# Altium footprint library pcb.PcbLib: 397 footprints (part 3 of 25)
Each footprint in its own frame and in the unit in brackets; x right, y up, seen from the top. Pads: shape width x height; smd on the part's side, far side on the other; paste and mask are expansions set on the pad; w line width, h text height; cw(c..) or ccw(c..) is an arc to the next point about the centre after c.
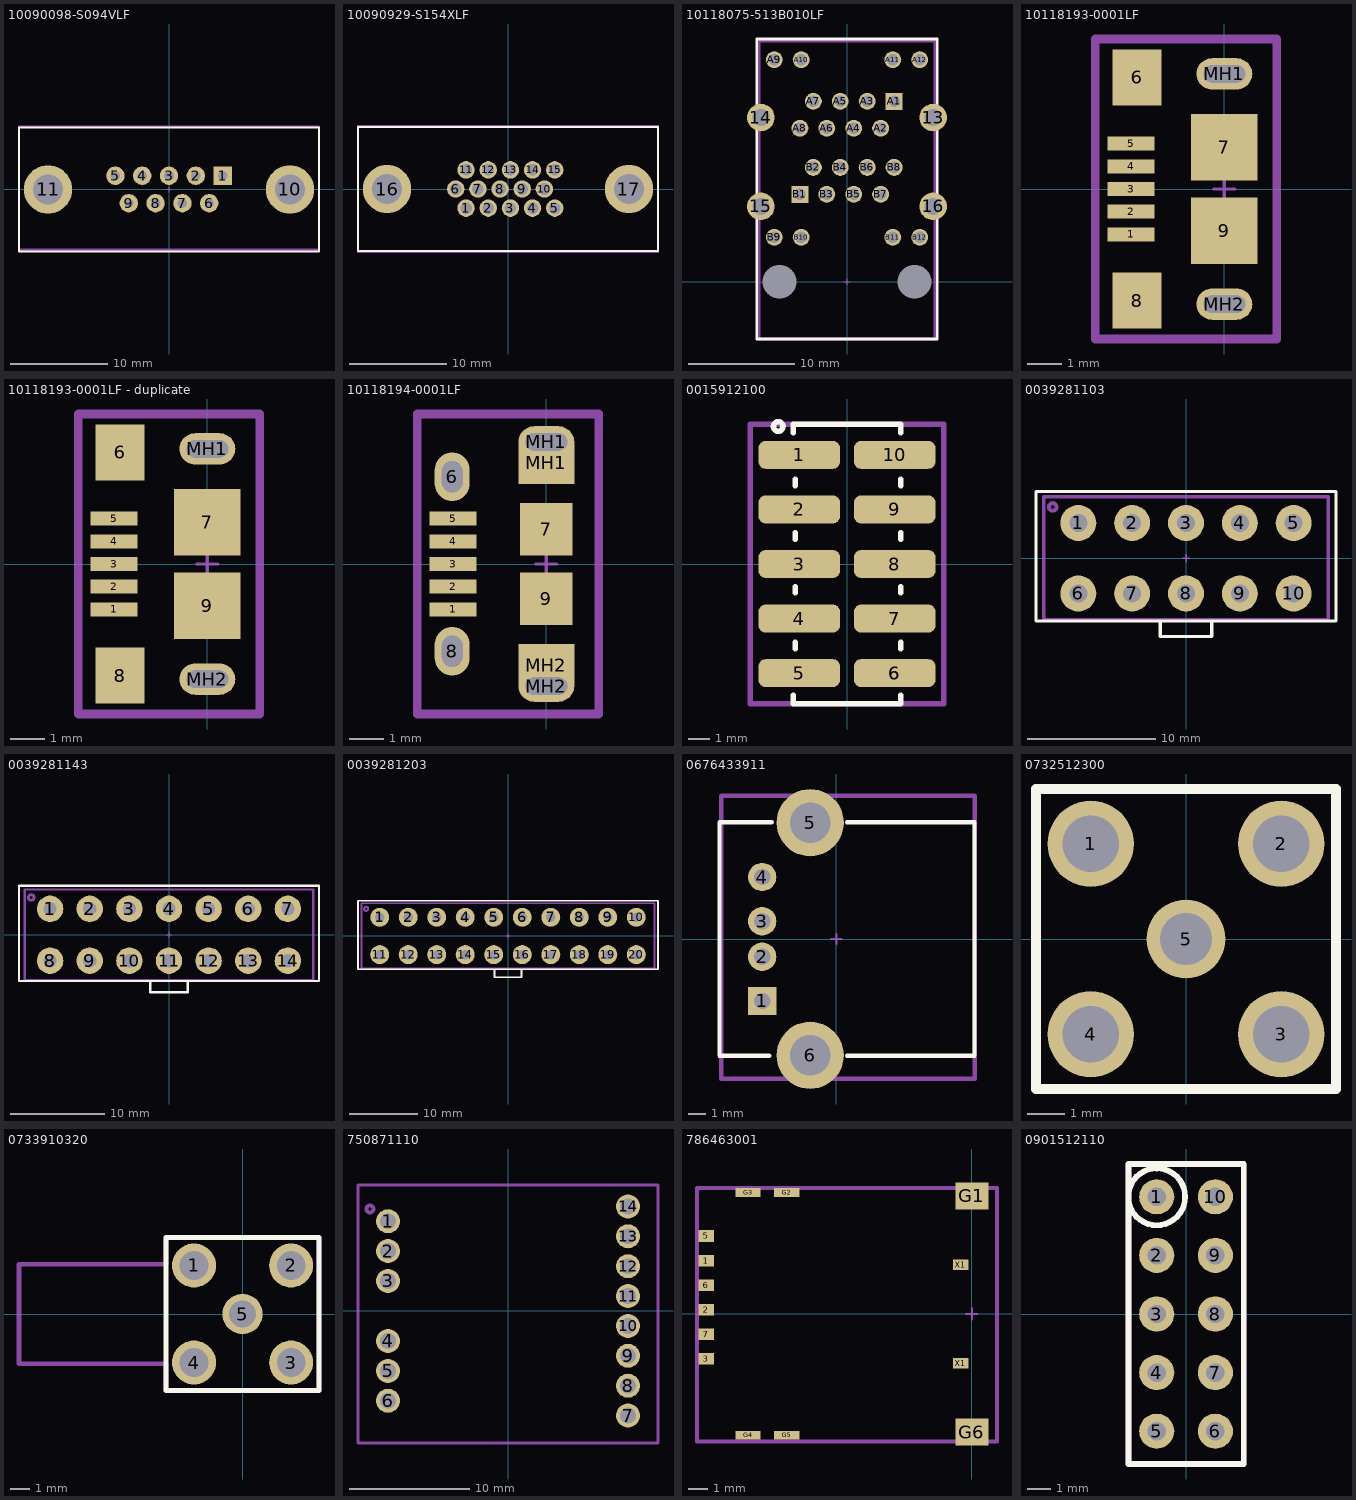
[diagram p2: the footprints below, top view; thin cyan lines are the x and y axes]

## 10090098-S094VLF [mm]
height 2.38
pads (11):
  rect 1.9x1.9 hole 1: 1(5.54,1.42)
  round 1.9 hole 1: 2(2.77,1.42) 3(0,1.42) 4(-2.77,1.42) 5(-5.54,1.42) 6(4.155,-1.42) 7(1.385,-1.42) 8(-1.385,-1.42) 9(-4.155,-1.42)
  round 5 hole 3.1: 10(12.5,0) 11(-12.5,0)
Top Overlay:
  lines w0.2: -15.5,-6.4 15.5,-6.4 15.5,6.4 -15.5,6.4 -15.5,-6.4
Mechanical 15:
  lines w0.1: -0.3,0 0.3,0 ; 0,-0.3 0,0.3
  lines w0.254: -15.5,-6.25 15.5,-6.25 15.5,6.5 -15.5,6.5 -15.5,-6.25
  text ".Designator" at -5.5,4 h1.02
3D body "c-1-1634218-2-f-3d.stp": height 13, standoff -3.9, extent -15.4,-6.3 15.4,6.25

## 10090929-S154XLF [mm]
height 2.38
pads (17):
  round 1.8 hole 1.2: 1(-4.33,-1.98) 2(-2.04,-1.98) 3(0.25,-1.98) 4(2.54,-1.98) 5(4.83,-1.98) 6(-5.402,0) 7(-3.112,0) 8(-0.817,0) 9(1.468,0) 10(3.758,0) 11(-4.33,1.98) 12(-2.04,1.98) 13(0.25,1.98) 14(2.54,1.98) 15(4.83,1.98)
  round 5 hole 3.1: 16(-12.5,0) 17(12.5,0)
Top Overlay:
  lines w0.2: -15.5,-6.4 -15.5,6.4 15.5,6.4 15.5,-6.4 -15.5,-6.4
Mechanical 15:
  lines w0.1: -0.3,0 0.3,0 ; 0,-0.3 0,0.3
  lines w0.254: -15.5,-6.5 15.5,-6.5 15.5,6.5 -15.5,6.5 -15.5,-6.5
  text ".Designator" at -11.75,4.5 h1.02
3D body "10090929-S15.stp": height 12.05, standoff -4.15, extent -15.405,-6.3 15.405,6.25

## 10118075-513B010LF [mm]
height 13.8
pads (30):
  round 2.6 hole 1.6: 13(8.13,15.49) 14(-8.13,15.49) 15(-8.13,7.11) 16(8.13,7.11)
  rect 1.6x1.6 hole 1.1: A1(4.445,17.02) B1(-4.445,8.25)
  round 1.6 hole 1.1: A2(3.175,14.48) A3(1.905,17.02) A4(0.635,14.48) A5(-0.635,17.02) A6(-1.905,14.48) A7(-3.175,17.02) A8(-4.445,14.48) A9(-6.86,20.95) A10(-4.32,20.95) A11(4.32,20.95) A12(6.86,20.95) B2(-3.175,10.79) B3(-1.905,8.25) B4(-0.635,10.79) B5(0.635,8.25) B6(1.905,10.79) B7(3.175,8.25) B8(4.445,10.79) B9(-6.86,4.19) B10(-4.32,4.19) B11(4.32,4.19) B12(6.86,4.19)
  round 0 hole 3.2 unplated: ""(-6.35,0) ""(6.35,0)
Top Overlay:
  lines w0.254: -8.5,-5.4 -8.5,22.9 8.5,22.9 8.5,-5.4 -8.5,-5.4
Mechanical 15:
  lines w0.1: -0.3,0 0.3,0 ; 0,-0.3 0,0.3
  lines w0.254: -8.3,-5.4 -8.3,22.7 8.3,22.7 8.3,-5.4 -8.3,-5.4
  text ".Designator" at -5.1,-4.5 h1.02
  text "pcb_edge" at -3.9,-6.8 h1.02
3D body "10118075.stp": height 26.22, standoff -3.3, extent -9.275,-5.6 9.275,22.65

## 10118193-0001LF [mm] "Connector; Micro USB Type B; 5 Position; Right Angle"
height 2
pads (11):
  rect 1.35x0.4 smd: 1(-2.675,-1.3) 2(-2.675,-0.65) 3(-2.675,0) 4(-2.675,0.65) 5(-2.675,1.3)
  rect 1.4x1.6 smd: 6(-2.5,3.2) 8(-2.5,-3.2)
  rect 1.9x1.9 smd: 7(0,1.2) 9(0,-1.2)
  oval 1.6x0.9 hole 0.5 slot 1.2 at 0 deg: MH1(0,3.3) MH2(0,-3.3)
Mechanical 15:
  lines w0.1: -0.3,0 0.3,0 ; 0,-0.3 0,0.3
  lines w0.254: -3.7,-4.3 -3.7,4.3 1.5,4.3 1.5,-4.3 -3.7,-4.3
  text "pcb_edge" at 2.6,-3.8 h1.02
  text ".Designator" at -1.2,-3.6 h1.02
3D body "10118193-0001lfc.stp": height 2.78, standoff -0.82, extent -2.961,-3.928 2.7,3.928

## 10118193-0001LF - duplicate [mm] "Connector; Micro USB Type B; 5 Position; Right Angle"
height 2
pads (11):
  rect 1.35x0.4 smd: 1(-2.675,-1.3) 2(-2.675,-0.65) 3(-2.675,0) 4(-2.675,0.65) 5(-2.675,1.3)
  rect 1.4x1.6 smd: 6(-2.5,3.2) 8(-2.5,-3.2)
  rect 1.9x1.9 smd: 7(0,1.2) 9(0,-1.2)
  oval 1.6x0.9 hole 0.5 slot 1.2 at 0 deg: MH1(0,3.3) MH2(0,-3.3)
Mechanical 15:
  lines w0.1: -0.3,0 0.3,0 ; 0,-0.3 0,0.3
  lines w0.254: -3.7,-4.3 -3.7,4.3 1.5,4.3 1.5,-4.3 -3.7,-4.3
  text "pcb_edge" at 2.6,-3.8 h1.02
  text ".Designator" at -1.2,-3.6 h1.02
3D body "10118193-0001lfc.stp": height 2.78, standoff -0.82, extent -2.961,-3.928 2.7,3.928

## 10118194-0001LF [mm] "Connector; Micro USB Type B; 5 Position; Right Angle"
height 2
pads (13):
  rect 1.35x0.4 smd: 1(-2.675,-1.3) 2(-2.675,-0.65) 3(-2.675,0) 4(-2.675,0.65) 5(-2.675,1.3)
  oval 1x1.4 hole 0.6 slot 0.9 at 90 deg: 6(-2.7,2.5) 8(-2.7,-2.5)
  rect 1.5x1.5 smd: 7(0,1) 9(0,-1)
  rect 1.6x1.2 smd: MH1(0,2.9) MH2(0,-2.9)
  oval 1.6x0.9 hole 0.5 slot 1.2 at 0 deg: MH1(0,3.5) MH2(0,-3.5)
Mechanical 15:
  lines w0.1: -0.3,0 0.3,0 ; 0,-0.3 0,0.3
  lines w0.254: -3.7,-4.3 1.5,-4.3 1.5,4.3 -3.7,4.3 -3.7,-4.3
  text ".Designator" at -1.2,-3.6 h1.02
  text "pcb_edge" at 2.6,-3.8 h1.02
3D body "10118194.stp": height 2.73, standoff -0.55, extent -2.9,-4.025 2.68,4.025

## 0015912100 [mm] "5 X 2 MALE PIN SMD H6.1 P2.54"
pads (11):
  rrect50% 3.8x1.3 smd: 1(-2.22,5.08) 2(-2.22,2.54) 3(-2.22,0) 4(-2.22,-2.54) 5(-2.22,-5.08) 6(2.22,-5.08) 6(2.22,-5.08) 7(2.22,-2.54) 8(2.22,0) 9(2.22,2.54) 10(2.22,5.08)
Top Overlay:
  circle w0.254: c-3.2,6.4 r0.224
  lines w0.254: -2.5,-6.1 -2.5,-6.5 -2,-6.5 2.5,-6.5 2.5,-6.1 ; -2.5,6.1 -2.5,6.5 -2,6.5 2.5,6.5 2.5,6.1 ; -2.4,-3.95 -2.4,-3.65 ; -2.4,-1.35 -2.4,-1.05 ; -2.4,1.15 -2.4,1.45 ; -2.4,3.65 -2.4,3.95 ; 2.5,-3.95 2.5,-3.65 ; 2.5,-1.35 2.5,-1.05 ; 2.5,1.15 2.5,1.45 ; 2.5,3.65 2.5,3.95
Mechanical 15:
  lines w0.254: -4.5,-6.5 -4.5,6.5 4.5,6.5 4.5,-6.5 -4.5,-6.5
3D body "Male_pin.stp": height 9.74, standoff 0.09, extent -3.493,-6.35 3.492,6.35

## 0039281103 [mm] "Mini-Fit Jr."
height 12.8
pads (10):
  round 2.8 hole 1.4: 1(-8.4,2.75) 2(-4.2,2.75) 3(0,2.75) 4(4.2,2.75) 5(8.4,2.75) 6(-8.4,-2.75) 7(-4.2,-2.75) 8(0,-2.75) 9(4.2,-2.75) 10(8.4,-2.75)
Top Overlay:
  lines w0.254: -2,-4.9 -2,-6.1 2,-6.1 2,-4.9 ; -11.7,-4.9 -11.7,5.2 11.7,5.2 11.7,-4.9 -11.7,-4.9
Mechanical 15:
  circle w0.3: c-10.4,4 r0.3
  lines w0.1: -0.3,0 0.3,0 ; 0,-0.3 0,0.3
  lines w0.254: -11.1,-4.8 -11.1,4.8 11.1,4.8 11.1,-4.8 -11.1,-4.8
  text "1" at -10.5,2.2 h1.02
  text ".Designator" at -10.4,-0.4 h1.02
3D body "039281103.stp": height 12.8, standoff -3.5, extent -11.5,-6 11.5,5

## 0039281143 [mm] "Mini-Fit Jr."
height 12.8
pads (14):
  round 2.8 hole 1.4: 1(-12.6,2.75) 2(-8.4,2.75) 3(-4.2,2.75) 4(0,2.75) 5(4.2,2.75) 6(8.4,2.75) 7(12.6,2.75) 8(-12.6,-2.75) 9(-8.4,-2.75) 10(-4.2,-2.75) 11(0,-2.75) 12(4.2,-2.75) 13(8.4,-2.75) 14(12.6,-2.75)
Top Overlay:
  lines w0.254: -2,-4.9 -2,-6.1 2,-6.1 2,-4.9 ; -15.9,-4.9 15.9,-4.9 15.9,5.2 -15.9,5.2 -15.9,-4.9
Mechanical 15:
  circle w0.3: c-14.6,3.95 r0.3
  lines w0.1: -0.3,0 0.3,0 ; 0,-0.3 0,0.3
  lines w0.254: -15.3,-4.8 15.3,-4.8 15.3,4.8 -15.3,4.8 -15.3,-4.8
  text ".Designator" at -14.7,-0.6 h1.02
  text "1" at -14.7,2.15 h1.02
3D body "039281143.stp": height 12.8, standoff -3.5, extent -15.7,-6 15.7,5

## 0039281203 [mm] "Mini-Fit Jr."
height 12.8
pads (20):
  round 2.8 hole 1.4: 1(-18.9,2.75) 2(-14.7,2.75) 3(-10.5,2.75) 4(-6.3,2.75) 5(-2.1,2.75) 6(2.1,2.75) 7(6.3,2.75) 8(10.5,2.75) 9(14.7,2.75) 10(18.9,2.75) 11(-18.9,-2.75) 12(-14.7,-2.75) 13(-10.5,-2.75) 14(-6.3,-2.75) 15(-2.1,-2.75) 16(2.1,-2.75) 17(6.3,-2.75) 18(10.5,-2.75) 19(14.7,-2.75) 20(18.9,-2.75)
Top Overlay:
  lines w0.254: -2,-4.9 -2,-6.1 2,-6.1 2,-4.9 ; -22.1,-4.9 22.1,-4.9 22.1,5.2 -22.1,5.2 -22.1,-4.9
Mechanical 15:
  circle w0.3: c-20.9,4 r0.3
  lines w0.1: -0.3,0 0.3,0 ; 0,-0.3 0,0.3
  lines w0.254: -21.6,-4.8 21.6,-4.8 21.6,4.8 -21.6,4.8 -21.6,-4.8
  text ".Designator" at -20.7,-0.7 h1.02
  text "1" at -21,2.2 h1.02
3D body "039281203.stp": height 12.8, standoff -3.5, extent -22,-6 22,5

## 0676433911 [mm] "Connector; USB1.1, Type A, Thru-Hole; 4 Position; Horizontal"
height 15
pads (6):
  rect 1.6x1.6 hole 0.92: 1(-4.19,-3.5)
  round 1.6 hole 0.92: 2(-4.19,-1) 3(-4.19,1) 4(-4.19,3.5)
  round 3.8 hole 2.3: 5(-1.48,6.57) 6(-1.48,-6.57)
Top Overlay:
  lines w0.25: -3.8,-6.6 -6.6,-6.6 -6.6,6.6 -3.65,6.6 ; 0.6,-6.6 7.8,-6.6 7.8,6.6 0.6,6.6
Mechanical 15:
  lines w0.1: -0.3,0 0.3,0 ; 0,-0.3 0,0.3
  lines w0.254: -6.5,-7.9 7.8,-7.9 7.8,8.1 -6.5,8.1 -6.5,-7.9
  text "pcb_edge" at 9,-5.4 h1.02
  text ".Designator" at -1.1,-3.9 h1.02
3D body "676433911.stp": height 7.73, standoff -3.7, extent -6.43,-7.9 8.83,8.099

## 0732512300 [mm] "RPSMA"
height 9.6
pads (5):
  round 2.3 hole 1.5: 1(-2.54,2.54) 2(2.54,2.54) 3(2.54,-2.54) 4(-2.54,-2.54)
  round 2.1 hole 1.4: 5(0,0)
Top Overlay:
  lines w0.254: -4,-4 -4,4 4,4 4,-4 -4,-4
Mechanical 15:
  lines w0.1: -0.3,0 0.3,0 ; 0,-0.3 0,0.3
  lines w0.254: -4,-4 4,-4 4,4 -4,4 -4,2.6 -4,-2.6 -4,-4
  text ".Designator" at -2.9,-2.7 h1.02
3D body: height 9.5, standoff 1.5, extent -2.536,-2.539 2.54,2.539
3D body: height 1.5, standoff 0, extent -3.2,-3.2 3.2,3.2

## 0733910320 [mm] "RPSMA"
height 9.6
pads (5):
  round 2.3 hole 1.5: 1(-2.54,2.54) 2(2.54,2.54) 3(2.54,-2.54) 4(-2.54,-2.54)
  round 2.1 hole 1.4: 5(0,0)
Top Overlay:
  lines w0.254: -4,-4 -4,4 4,4 4,-4 -4,-4
Mechanical 15:
  lines w0.1: -0.3,0 0.3,0 ; 0,-0.3 0,0.3
  lines w0.254: -11.7,-2.6 -4,-2.6 -4,-4 4,-4 4,4 -4,4 -4,2.6 -11.7,2.6 -11.7,-2.6
  text ".Designator" at -10.9,-1.9 h1.02
3D body: height 8.92, standoff 3.86, extent -11.702,-2.54 -3.302,2.53
3D body: height 9.6, standoff 0, extent -3.2,-3.2 3.2,3.2

## 750871110 [mm] "TRANSFORMER 1.6 mH 4.8 OHM"
pads (14):
  round 2 hole 1.32 unplated: 1(-10,7.48) 2(-10,4.99) 3(-10,2.5) 4(-10,-2.5) 5(-10,-4.99) 6(-10,-7.48)
  round 2 hole 1.32: 7(10,-8.715) 8(10,-6.225) 9(10,-3.735) 10(10,-1.245) 11(10,1.245) 12(10,3.735) 13(10,6.225) 14(10,8.715)
Mechanical 15:
  circle w0.3: c-11.5,8.5 r0.3
  lines w0.254: -10.9,-11 10.9,-11 ; -10.6,10.5 10.4,10.5 ; -10,10.5 -12.5,10.5 -12.5,-11 -8.5,-11 ; 9.5,10.5 12.5,10.5 12.5,8.5 ; 10,-11 12.5,-11 12.5,-9 ; 12.5,-9.9 12.5,9
  text "1" at -11.6,6.7 h1.02
  text ".Designator" at -8.4,6.6 h1.02
3D body: height 14, standoff 2, extent -12.5,-11 12.5,10.5

## 786463001 [mm]
height 1.45
pads (14):
  rect 0.8x0.6 smd: 1(-13.73,2.755) 2(-13.73,0.215) 3(-13.73,-2.325) 5(-13.73,4.025) 6(-13.73,1.485) 7(-13.73,-1.055)
  rect 1.7x1.4 smd: G1(0,6.1) G6(0,-6.11)
  rect 1.3x0.45 smd: G2(-9.56,6.27) G3(-11.56,6.27) G4(-11.56,-6.27) G5(-9.56,-6.27)
  rect 0.8x0.54 smd: X1(-0.58,-2.54) X1(-0.58,2.54)
Mechanical 15:
  lines w0.1: -0.3,0 0.3,0 ; 0,-0.3 0,0.3
  lines w0.2: -14.2,-6.6 1.3,-6.6 1.3,6.5 -14.2,6.5 -14.2,-6.6
  text ".Designator" at -0.8,-0.5 h1.02
  text "insert" at 2,-2.8 h1.02
3D body "786463001.stp": height 1.41, standoff -0.04, extent -14.15,-6.54 1.3,6.51

## 0901512110 [mil] "TH FEMALE PIN H8.1 P2.54"
pads (10):
  round 60 hole 31.5: 1(-50,200) 2(-50,100) 3(-50,0) 4(-50,-100) 5(-50,-200) 6(50,-200) 7(50,-100) 8(50,0) 9(50,100) 10(50,200)
Top Overlay:
  circle w10: c-50,200 r48.53
  lines w10: -98.43,-255.91 98.43,-255.91 98.43,255.91 -98.43,255.91 -98.43,-255.91
Mechanical 15:
  lines w10: -98.43,-255.91 -98.43,255.91 98.43,255.91 98.43,-255.91 -98.43,-255.91
3D body "female_pin.stp": height 336.61, standoff -112.2, extent -100,-246.06 100,253.94